# Altium footprint library FOC.PcbLib: 148 footprints (part 1 of 10)
Each footprint in its own frame and in the unit in brackets; x right, y up, seen from the top. Pads: shape width x height; smd on the part's side, far side on the other; paste and mask are expansions set on the pad; w line width, h text height; cw(c..) or ccw(c..) is an arc to the next point about the centre after c.
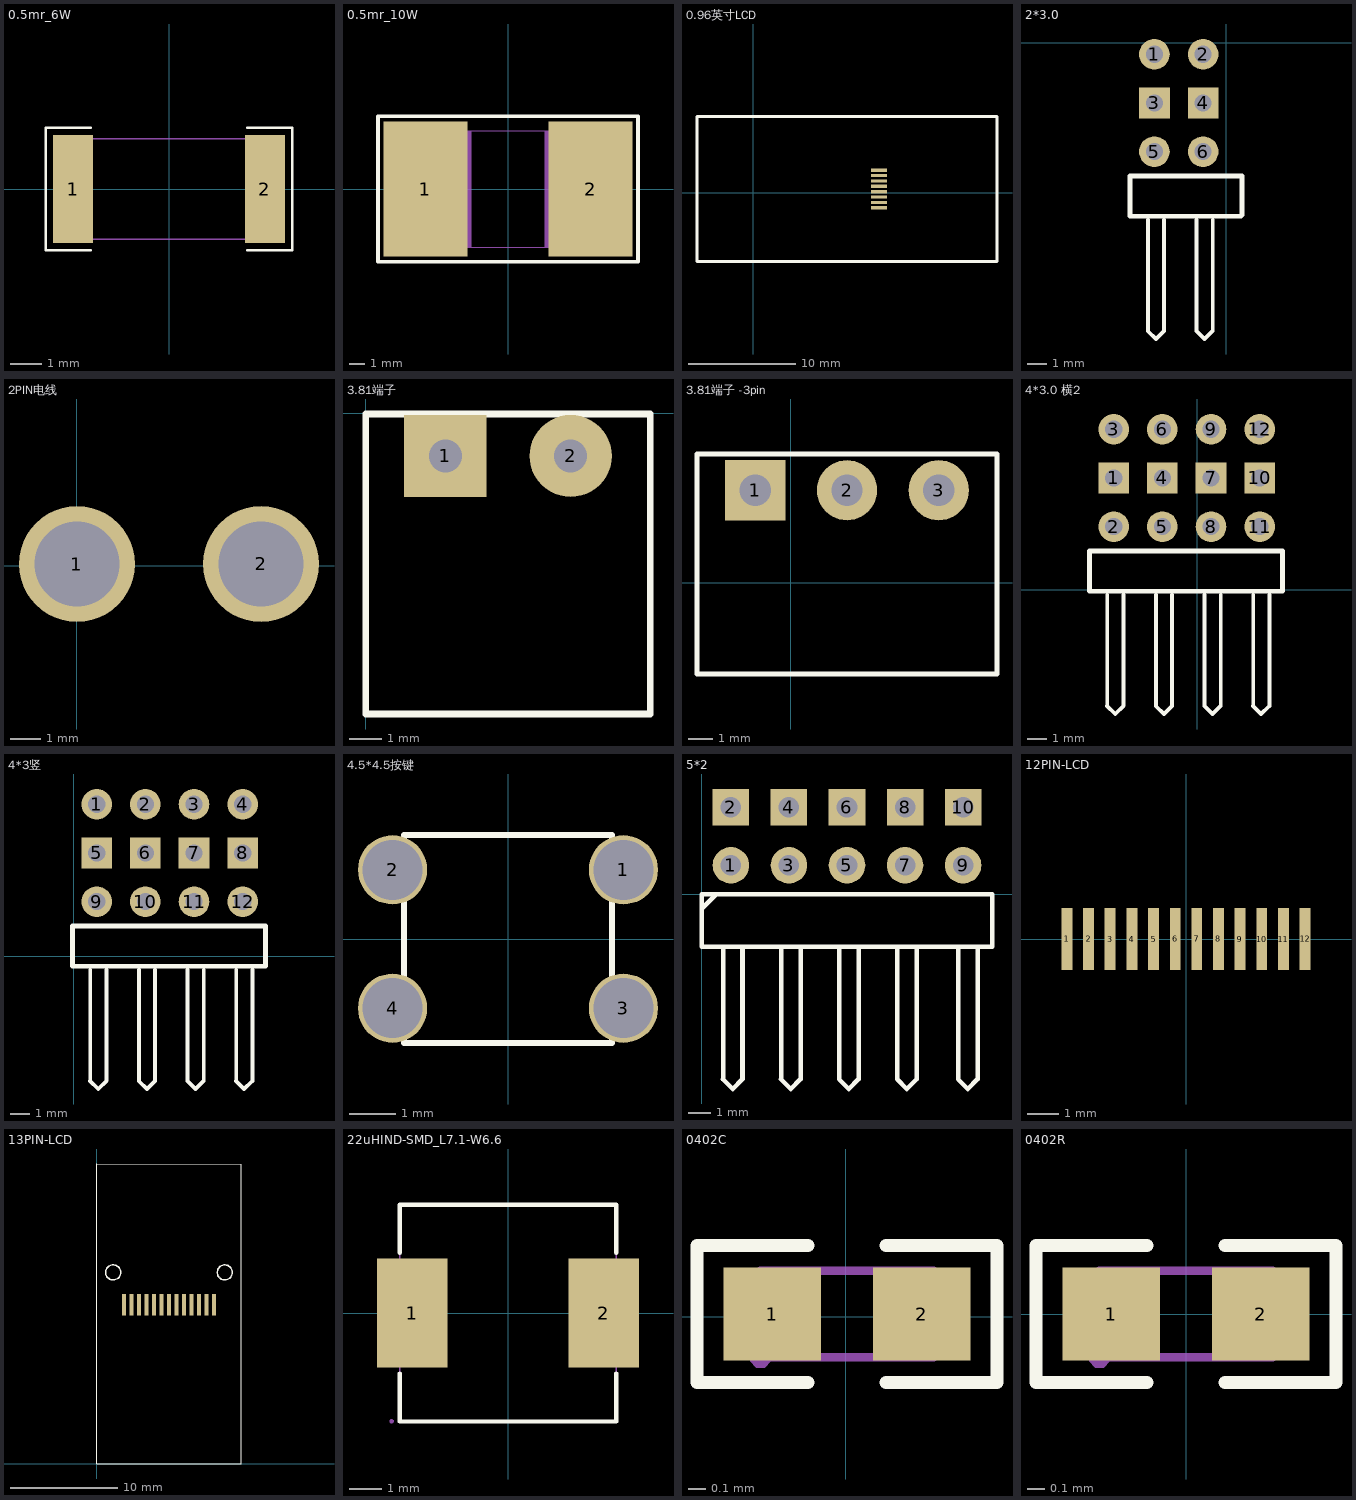
[diagram p0: the footprints below, top view; thin cyan lines are the x and y axes]

## 0.5mr_6W [mm]
pads (2):
  rect 1.283x3.456 smd mask+0.051: 1(-3.066,0) 2(3.066,0)
Top Overlay:
  lines w0.076: -2.501,-1.957 -3.936,-1.957 -3.936,1.957 -2.501,1.957 ; 2.501,-1.957 3.936,-1.957 3.936,1.957 2.501,1.957
Top Paste:
  region: 2.425,-1.628 2.425,-0.688 2.525,-0.588 2.761,-0.588 2.861,-0.488 2.861,0.488 2.761,0.588 2.525,0.588 2.425,0.688 2.425,1.628 2.525,1.728 3.608,1.728 3.708,1.628 3.708,-1.628 3.608,-1.728 2.525,-1.728
  region: -2.425,-1.628 -2.425,-0.688 -2.525,-0.588 -2.761,-0.588 -2.861,-0.488 -2.861,0.488 -2.761,0.588 -2.525,0.588 -2.425,0.688 -2.425,1.628 -2.525,1.728 -3.608,1.728 -3.708,1.628 -3.708,-1.628 -3.608,-1.728 -2.525,-1.728
Mechanical 15:
  region: -3.115,-1.6 -3.115,-1.575 -3.15,-1.54 -3.2,-1.54 -3.235,-1.575 -3.235,-1.6 -3.235,-1.625 -3.2,-1.66 -3.15,-1.66 -3.115,-1.625
  region: -3.15,-1.6 -3.15,1.6 -2.55,1.6 -2.55,-1.6
  region: 2.55,-1.6 2.55,1.6 3.15,1.6 3.15,-1.6
  lines w0.051: -3.15,-1.6 -3.15,1.6 3.15,1.6 3.15,-1.6 -3.15,-1.6
3D body "2512.STEP": height 0.61, standoff 0, extent -3.157,-1.614 3.143,1.586

## 0.5mr_10W [mm]
pads (2):
  rect 5.5x8.8 smd mask+0.051: 1(-5.4,0) 2(5.4,0)
Top Overlay:
  lines w0.254: -8.5,-4.75 -8.5,4.75 8.5,4.75 8.5,-4.75 -8.5,-4.75
Mechanical 15:
  region: -2.4,-3.8 -7.5,-3.8 -7.5,3.8 -2.4,3.8
  region: 2.4,3.8 7.5,3.8 7.5,-3.8 2.4,-3.8
  region: -7.44,-3.8 -7.44,-3.775 -7.475,-3.74 -7.525,-3.74 -7.56,-3.775 -7.56,-3.8 -7.56,-3.825 -7.525,-3.86 -7.475,-3.86 -7.44,-3.825
  lines w0.051: -7.5,-3.8 -7.5,3.8 7.5,3.8 7.5,-3.8 -7.5,-3.8

## 0.96英寸LCD [mil]
pads (8):
  rect 59.05x11.81 smd: 1(460,83.43) 2(460,63.74) 3(460,44.06) 4(460,24.37) 5(460,4.68) 6(460,-15) 7(460,-34.69) 8(460,-54.37)
Top Overlay:
  lines w10: -206.97,280.28 -206.97,-251.22 893.43,-251.22 893.43,280.28 -206.97,280.28 ; -206.97,280.28 -206.97,280.28
3D body "LCD-0.96inch.STEP": height 47.24, standoff 0, extent -205.2,-250.75 895.2,280.75

## 2*3.0 [mm]
pads (6):
  round 1.6 hole 0.9: 1(-3.754,-0.592) 2(-1.214,-0.592) 5(-3.754,-5.672) 6(-1.214,-5.672)
  rect 1.6x1.6 hole 0.9: 3(-3.754,-3.132) 4(-1.214,-3.132)
Top Overlay:
  lines w0.2: -4.102,-15.036 -3.679,-15.46 -3.255,-15.036 -3.246,-15.027 -3.246,-9.228 ; -4.093,-15.036 -4.093,-9.228 ; -1.562,-15.036 -1.139,-15.46 -0.715,-15.036 ; -1.553,-15.036 -1.553,-9.228 ; -0.706,-15.036 -0.706,-9.228
  lines w0.254: 0.762,-9.05 -5.024,-9.05 -5.024,-6.942 0.813,-6.942 0.813,-9

## 2PIN电线 [mil]
pads (2):
  round 150 hole 110: 1(0,2) 2(238,2)

## 3.81端子 [mm]
pads (2):
  rect 2.5x2.5 hole 1: 1(2.413,-1.3)
  round 2.5 hole 1: 2(6.223,-1.3)
Top Overlay:
  lines w0.2: 0,-9.144 0,-0.024 8.636,-0.024 8.636,-9.144 0,-9.144
3D body "3.81端子.STEP": height 7, standoff -3.7, extent -0.002,-9.172 8.638,0.028

## 3.81端子 -3pin [mm]
pads (3):
  rect 2.5x2.5 hole 1.3: 1(-1.473,3.835)
  round 2.5 hole 1.3: 2(2.337,3.835) 3(6.147,3.835)
Top Overlay:
  lines w0.2: 8.509,-3.785 -3.886,-3.785 -3.886,5.335 8.56,5.335 8.56,-3.785
3D body: height 5, standoff 0, extent -3.886,-3.785 8.509,5.232

## 4*3.0 横2 [mm]
pads (12):
  rect 1.6x1.6 hole 0.9: 1(-4.369,5.842) 4(-1.829,5.842) 7(0.711,5.842) 10(3.251,5.842)
  round 1.6 hole 0.9: 2(-4.369,3.302) 3(-4.369,8.382) 5(-1.829,3.302) 6(-1.829,8.382) 8(0.711,3.302) 9(0.711,8.382) 11(3.251,3.302) 12(3.251,8.382)
Top Overlay:
  lines w0.2: -4.717,-6.062 -4.293,-6.485 -3.87,-6.062 -3.861,-6.053 -3.861,-0.254 ; -4.707,-6.062 -4.707,-0.254 ; -2.177,-6.062 -1.753,-6.485 -1.33,-6.062 ; -2.167,-6.062 -2.167,-0.254 ; -1.321,-6.062 -1.321,-0.254 ; 0.363,-6.062 0.787,-6.485 1.21,-6.062 ; 0.373,-6.062 0.373,-0.254 ; 1.219,-6.062 1.219,-0.254 ; 2.903,-6.062 3.327,-6.485 3.75,-6.062 ; 2.913,-6.062 2.913,-0.254 ; 3.759,-6.062 3.759,-0.254
  lines w0.254: -5.639,-0.076 -5.639,2.032 4.445,2.032 4.445,-0.076 -5.639,-0.076

## 4*3竖 [mm]
pads (12):
  round 1.6 hole 0.9: 1(1.194,7.925) 2(3.734,7.925) 3(6.274,7.925) 4(8.814,7.925) 9(1.194,2.845) 10(3.734,2.845) 11(6.274,2.845) 12(8.814,2.845)
  rect 1.6x1.6 hole 0.9: 5(1.194,5.385) 6(3.734,5.385) 7(6.274,5.385) 8(8.814,5.385)
Top Overlay:
  lines w0.2: 0.846,-6.519 1.269,-6.942 1.693,-6.519 1.702,-6.51 1.702,-0.711 ; 0.855,-6.519 0.855,-0.711 ; 3.386,-6.519 3.809,-6.942 4.233,-6.519 ; 3.395,-6.519 3.395,-0.711 ; 4.242,-6.519 4.242,-0.711 ; 5.926,-6.519 6.349,-6.942 6.773,-6.519 ; 5.935,-6.519 5.935,-0.711 ; 6.782,-6.519 6.782,-0.711 ; 8.466,-6.519 8.889,-6.942 9.313,-6.519 ; 8.475,-6.519 8.475,-0.711 ; 9.322,-6.519 9.322,-0.711
  lines w0.254: -0.076,-0.533 10.008,-0.533 10.008,1.575 -0.076,1.575 -0.076,-0.533

## 4.5*4.5按键 [mm]
pads (4):
  round 1.5 hole 1.3: 1(2.5,1.5) 2(-2.5,1.5) 3(2.5,-1.5) 4(-2.5,-1.5)
Top Overlay:
  lines w0.127: -2.25,-2.25 -2.25,2.25 2.25,2.25 2.25,-2.25 -2.25,-2.25

## 5*2 [mm]
pads (10):
  round 1.6 hole 0.9: 1(1.27,1.27) 3(3.81,1.27) 5(6.35,1.27) 7(8.89,1.27) 9(11.43,1.27)
  rect 1.6x1.6 hole 0.9: 2(1.27,3.81) 4(3.81,3.81) 6(6.35,3.81) 8(8.89,3.81) 10(11.43,3.81)
Top Overlay:
  lines w0.2: 0,-0.635 0.635,0 ; 0.922,-8.094 1.345,-8.517 1.769,-8.094 1.778,-8.085 1.778,-2.286 ; 0.931,-8.094 0.931,-2.286 ; 3.462,-8.094 3.885,-8.517 4.309,-8.094 ; 3.471,-8.094 3.471,-2.286 ; 4.318,-8.094 4.318,-2.286 ; 6.002,-8.094 6.425,-8.517 6.849,-8.094 ; 6.011,-8.094 6.011,-2.286 ; 6.858,-8.094 6.858,-2.286 ; 8.542,-8.094 8.965,-8.517 9.389,-8.094 ; 8.551,-8.094 8.551,-2.286 ; 9.398,-8.094 9.398,-2.286 ; 11.209,-8.094 11.632,-8.517 12.056,-8.094 ; 11.218,-8.094 11.218,-2.286 ; 12.065,-8.094 12.065,-2.286 ; 0,-2.286 0,0 12.7,0 12.7,-2.286 0,-2.286

## 12PIN-LCD [mm]
pads (12):
  rect 0.35x2 smd: 1(-3.85,0.005) 2(-3.15,0.005) 3(-2.454,-0.005) 4(-1.751,-0.005) 5(-1.048,-0.005) 6(-0.35,0.005) 7(0.35,0.005) 9(1.746,-0.005) 10(2.449,-0.005) 11(3.152,-0.005) 12(3.85,0.005)
  rect 0.35x2 smd paste+0: 8(1.05,0.005)

## 13PIN-LCD [mm]
pads (13):
  rect 0.35x2 smd: 1(2.55,14.85) 2(3.25,14.85) 3(3.946,14.85) 4(4.649,14.85) 5(5.352,14.85) 6(6.05,14.85) 7(6.75,14.85) 9(8.146,14.85) 10(8.849,14.85) 11(9.552,14.85) 12(10.25,14.85) 13(10.95,14.85)
  rect 0.35x2 smd paste+0: 8(7.45,14.85)
Top Overlay:
  circle w0.127: c11.95,17.85 r0.7
  circle w0.127: c1.55,17.85 r0.7
  lines w0.013: 0,27.95 0,0 3.302,0 10.033,0 13.5,0 13.5,27.95
  lines w0.076: 0,27.95 13.5,27.95
3D body "LCD-0.96inch.STEP": height 1.2, standoff 0, extent 0,0 13.5,27.95

## 22uHIND-SMD_L7.1-W6.6 [mm]
pads (2):
  rect 2.15x3.32 smd mask+0.051: 1(-2.913,0) 2(2.913,0)
Top Overlay:
  lines w0.127: -3.302,-1.84 -3.302,-3.302 3.302,-3.302 3.302,-1.84 ; -3.302,1.84 -3.302,3.302 3.302,3.302 3.302,1.84
Mechanical 15:
  region: -3.49,-3.3 -3.49,-3.275 -3.525,-3.24 -3.575,-3.24 -3.61,-3.275 -3.61,-3.3 -3.61,-3.325 -3.575,-3.36 -3.525,-3.36 -3.49,-3.325 -3.49,-3.3
  region: -3.55,1.5 -1.95,1.5 -1.95,-1.5 -3.55,-1.5
  region: 1.95,1.5 3.55,1.5 3.55,-1.5 1.95,-1.5
  lines w0.051: -3.3,-3.3 3.3,-3.3 3.3,3.3 -3.3,3.3 -3.3,-3.3

## 0402C [mm]
pads (2):
  rect 0.566x0.54 smd mask+0.051: 1(-0.427,0.015) 2(0.439,0.015)
Top Overlay:
  lines w0.076: -0.22,-0.382 -0.862,-0.382 -0.862,0.412 -0.22,0.412 ; 0.232,-0.382 0.874,-0.382 0.874,0.412 0.232,0.412
Top Paste:
  region: 0.141,-0.215 0.141,0.245 0.181,0.285 0.682,0.285 0.722,0.245 0.722,-0.215 0.682,-0.255 0.181,-0.255
  region: -0.129,-0.215 -0.129,0.245 -0.169,0.285 -0.67,0.285 -0.71,0.245 -0.71,-0.215 -0.67,-0.255 -0.169,-0.255
Mechanical 15:
  region: -0.434,-0.235 -0.434,-0.21 -0.469,-0.175 -0.519,-0.175 -0.554,-0.21 -0.554,-0.235 -0.554,-0.26 -0.519,-0.295 -0.469,-0.295 -0.434,-0.26
  region: 0.257,-0.235 0.257,0.265 0.507,0.265 0.507,-0.235
  region: -0.243,0.265 -0.243,-0.235 -0.493,-0.235 -0.493,0.265
  lines w0.051: -0.494,-0.235 -0.494,0.265 0.506,0.265 0.506,-0.235 -0.494,-0.235
3D body "c0402c103k4ractu.STEP": height 0.53, standoff -0.02, extent -0.546,-0.259 0.504,0.291

## 0402R [mm]
pads (2):
  rect 0.566x0.54 smd mask+0.051: 1(-0.433,0) 2(0.433,0)
Top Overlay:
  lines w0.076: -0.226,-0.397 -0.868,-0.397 -0.868,0.397 -0.226,0.397 ; 0.226,-0.397 0.868,-0.397 0.868,0.397 0.226,0.397
Top Paste:
  region: 0.135,-0.23 0.135,0.23 0.175,0.27 0.676,0.27 0.716,0.23 0.716,-0.23 0.676,-0.27 0.175,-0.27
  region: -0.135,-0.23 -0.135,0.23 -0.175,0.27 -0.676,0.27 -0.716,0.23 -0.716,-0.23 -0.676,-0.27 -0.175,-0.27
Mechanical 15:
  region: -0.44,-0.25 -0.44,-0.225 -0.475,-0.19 -0.525,-0.19 -0.56,-0.225 -0.56,-0.25 -0.56,-0.275 -0.525,-0.31 -0.475,-0.31 -0.44,-0.275
  region: 0.251,-0.25 0.251,0.25 0.501,0.25 0.501,-0.25
  region: -0.249,0.25 -0.249,-0.25 -0.499,-0.25 -0.499,0.25
  lines w0.051: -0.5,-0.25 -0.5,0.25 0.5,0.25 0.5,-0.25 -0.5,-0.25
3D body "45983.stp": height 0.55, standoff -0.05, extent -0.499,-0.252 0.501,0.248